# Altium footprint library PHOENIX THD.PcbLib: 109 footprints (part 2 of 8) (continued)
## PHOENIX_1725724 [mm] "Micro PCB Terminal Block, Pitch 2.54mm, 9 Positions, Screw Connection" (continued)
3D body "PHOENIX_1725724.stp": height 8.5, standoff -3.5, extent -11.66,-3.1 11.66,3.1

## PHOENIX_1725737 [mm] "Micro PCB Terminal Block, Pitch 2.54mm, 10 Positions, Screw Connection"
height 8.5
pads (10):
  round 1.8 hole 1.1: 1(-11.43,0) 2(-8.89,0) 3(-6.35,0) 4(-3.81,0) 5(-1.27,0) 6(1.27,0) 7(3.81,0) 8(6.35,0) 9(8.89,0) 10(11.43,0)
Top Overlay:
  circle w0.2: c-11.43,-0.05 r1.18
  circle w0.2: c-8.89,-0.05 r1.18
  circle w0.2: c-6.35,-0.05 r1.18
  circle w0.2: c-3.81,-0.05 r1.18
  circle w0.2: c-1.27,-0.05 r1.18
  circle w0.2: c1.27,-0.05 r1.18
  circle w0.2: c3.81,-0.05 r1.18
  circle w0.2: c6.35,-0.05 r1.18
  circle w0.2: c8.89,-0.05 r1.18
  circle w0.2: c11.43,-0.05 r1.18
  lines w0.2: -12.93,-2.8 12.93,-2.8 ; -12.93,-2.361 12.93,-2.361 ; -12.93,-1.51 12.93,-1.51 ; -12.93,-1.22 12.93,-1.22 ; -12.93,1.132 12.93,1.132 ; -12.93,1.417 12.93,1.417 ; -11.43,-3.81 -11.43,-3.429 ; -8.89,-3.81 -8.89,-3.429 ; -6.35,-3.81 -6.35,-3.429 ; -3.81,-3.81 -3.81,-3.429 ; -1.27,-3.81 -1.27,-3.429 ; 1.27,-3.81 1.27,-3.429 ; 3.81,-3.81 3.81,-3.429 ; 6.35,-3.81 6.35,-3.429 ; 8.89,-3.81 8.89,-3.429 ; 11.43,-3.81 11.43,-3.429 ; -12.93,-3.1 12.93,-3.1 12.93,3.1 -12.93,3.1 -12.93,-3.1
  text "9" at 8.509,1.778 h1
  text "8" at 5.969,1.778 h1
  text "6" at 0.889,1.778 h1
  text "4" at -4.191,1.778 h1
  text "1" at -11.557,1.778 h1
  text "2" at -9.271,1.778 h1
  text "3" at -6.731,1.778 h1
  text "5" at -1.651,1.778 h1
  text "7" at 3.429,1.778 h1
  text "10" at 11.049,1.778 h1
Mechanical 8:
  lines w0.1: -0.55,0 0,0 0,-0.55 ; -11.98,0 -11.43,0 ; -11.98,0 -11.43,0 ; -11.98,0 -11.43,0 ; -11.98,0 -11.43,0 ; -11.43,-0.55 -11.43,0 ; -11.43,-0.55 -11.43,0 ; -11.43,-0.55 -11.43,0 ; -11.43,-0.55 -11.43,0 ; -9.44,0 -8.89,0 ; -9.44,0 -8.89,0 ; -9.44,0 -8.89,0 ; -9.44,0 -8.89,0 ; -8.89,-0.55 -8.89,0 ; -8.89,-0.55 -8.89,0 ; -8.89,-0.55 -8.89,0 ; -8.89,-0.55 -8.89,0 ; -6.9,0 -6.35,0 ; -6.9,0 -6.35,0 ; -6.9,0 -6.35,0 ; -6.9,0 -6.35,0 ; -6.35,-0.55 -6.35,0 ; -6.35,-0.55 -6.35,0 ; -6.35,-0.55 -6.35,0 ; -6.35,-0.55 -6.35,0 ; -4.36,0 -3.81,0 ; -4.36,0 -3.81,0 ; -4.36,0 -3.81,0 ; -4.36,0 -3.81,0 ; -3.81,-0.55 -3.81,0 ; -3.81,-0.55 -3.81,0 ; -3.81,-0.55 -3.81,0 ; -3.81,-0.55 -3.81,0 ; -1.82,0 -1.27,0 ; -1.82,0 -1.27,0 ; -1.82,0 -1.27,0 ; -1.82,0 -1.27,0 ; -1.27,-0.55 -1.27,0 ; -1.27,-0.55 -1.27,0 ; -1.27,-0.55 -1.27,0 ; -1.27,-0.55 -1.27,0 ; 0.72,0 1.27,0 ; 0.72,0 1.27,0 ; 0.72,0 1.27,0 ; 0.72,0 1.27,0 ; 1.27,-0.55 1.27,0 ; 1.27,-0.55 1.27,0 ; 1.27,-0.55 1.27,0 ; 1.27,-0.55 1.27,0 ; 3.26,0 3.81,0 ; 3.26,0 3.81,0 ; 3.26,0 3.81,0 ; 3.26,0 3.81,0 ; 3.81,-0.55 3.81,0 ; 3.81,-0.55 3.81,0 ; 3.81,-0.55 3.81,0 ; 3.81,-0.55 3.81,0 ; 5.8,0 6.35,0 ; 5.8,0 6.35,0 ; 5.8,0 6.35,0 ; 5.8,0 6.35,0 ; 6.35,-0.55 6.35,0 ; 6.35,-0.55 6.35,0 ; 6.35,-0.55 6.35,0 ; 6.35,-0.55 6.35,0 ; 8.34,0 8.89,0 ; 8.34,0 8.89,0 ; 8.34,0 8.89,0 ; 8.34,0 8.89,0 ; 8.89,-0.55 8.89,0 ; 8.89,-0.55 8.89,0 ; 8.89,-0.55 8.89,0 ; 8.89,-0.55 8.89,0 ; 10.88,0 11.43,0 ; 10.88,0 11.43,0 ; 10.88,0 11.43,0 ; 10.88,0 11.43,0 ; 11.43,-0.55 11.43,0 ; 11.43,-0.55 11.43,0 ; 11.43,-0.55 11.43,0 ; 11.43,-0.55 11.43,0
Mechanical 14:
  circle w0.1: c8.89,-0.05 r1.1
  circle w0.1: c1.27,-0.05 r1.1
  circle w0.1: c-3.81,-0.05 r1.1
  circle w0.1: c-6.35,-0.05 r1.1
  circle w0.1: c-8.89,-0.05 r1.1
  circle w0.1: c-11.43,-0.05 r1.1
  circle w0.1: c-1.27,-0.05 r1.1
  circle w0.1: c3.81,-0.05 r1.1
  circle w0.1: c6.35,-0.05 r1.1
  circle w0.1: c11.43,-0.05 r1.1
  lines w0.1: -12.93,-2.8 12.93,-2.8 ; -12.93,-2.361 12.93,-2.361 ; -12.93,-1.51 12.93,-1.51 ; -12.93,-1.22 12.93,-1.22 ; -12.93,1.132 12.93,1.132 ; -12.93,1.417 12.93,1.417 ; -12.364,-0.631 -10.849,0.884 ; -12.011,-0.984 -10.496,0.531 ; -9.824,-0.631 -8.309,0.884 ; -9.471,-0.984 -7.956,0.531 ; -7.284,-0.631 -5.769,0.884 ; -6.931,-0.984 -5.416,0.531 ; -4.744,-0.631 -3.229,0.884 ; -4.391,-0.984 -2.876,0.531 ; -2.204,-0.631 -0.689,0.884 ; -1.851,-0.984 -0.336,0.531 ; 0.336,-0.631 1.851,0.884 ; 0.689,-0.984 2.204,0.531 ; 2.876,-0.631 4.391,0.884 ; 3.229,-0.984 4.744,0.531 ; 5.416,-0.631 6.931,0.884 ; 5.769,-0.984 7.284,0.531 ; 7.956,-0.631 9.471,0.884 ; 8.309,-0.984 9.824,0.531 ; 10.496,-0.631 12.011,0.884 ; 10.849,-0.984 12.364,0.531 ; -12.93,-3.1 12.93,-3.1 12.93,3.1 -12.93,3.1 -12.93,-3.1 ; -11.905,1.757 cw(c-11.43,1.6) -10.955,1.757 cw(c-11.003,1.741) -10.982,1.696 cw(c-11.43,2.696) -11.878,1.696 cw(c-11.857,1.741) -11.905,1.757 ; -9.365,1.757 cw(c-8.89,1.6) -8.415,1.757 cw(c-8.463,1.741) -8.442,1.696 cw(c-8.89,2.696) -9.338,1.696 cw(c-9.317,1.741) -9.365,1.757 ; -6.825,1.757 cw(c-6.35,1.6) -5.875,1.757 cw(c-5.923,1.741) -5.902,1.696 cw(c-6.35,2.696) -6.798,1.696 cw(c-6.777,1.741) -6.825,1.757 ; -4.285,1.757 cw(c-3.81,1.6) -3.335,1.757 cw(c-3.383,1.741) -3.362,1.696 cw(c-3.81,2.696) -4.258,1.696 cw(c-4.237,1.741) -4.285,1.757 ; -1.745,1.757 cw(c-1.27,1.6) -0.795,1.757 cw(c-0.843,1.741) -0.822,1.696 cw(c-1.27,2.696) -1.718,1.696 cw(c-1.697,1.741) -1.745,1.757 ; 0.795,1.757 cw(c1.27,1.6) 1.745,1.757 cw(c1.697,1.741) 1.718,1.696 cw(c1.27,2.696) 0.822,1.696 cw(c0.843,1.741) 0.795,1.757 ; 3.335,1.757 cw(c3.81,1.6) 4.285,1.757 cw(c4.237,1.741) 4.258,1.696 cw(c3.81,2.696) 3.362,1.696 cw(c3.383,1.741) 3.335,1.757 ; 5.875,1.757 cw(c6.35,1.6) 6.825,1.757 cw(c6.777,1.741) 6.798,1.696 cw(c6.35,2.696) 5.902,1.696 cw(c5.923,1.741) 5.875,1.757 ; 8.415,1.757 cw(c8.89,1.6) 9.365,1.757 cw(c9.317,1.741) 9.338,1.696 cw(c8.89,2.696) 8.442,1.696 cw(c8.463,1.741) 8.415,1.757 ; 10.955,1.757 ccw(c11.003,1.741) 10.982,1.696 ccw(c11.43,2.696) 11.878,1.696 ccw(c11.857,1.741) 11.905,1.757 ccw(c11.43,1.6) 10.955,1.757
3D body "PHOENIX_1725737.stp": height 8.5, standoff -3.5, extent -12.93,-3.1 12.93,3.1

## PHOENIX_1727036 [mm] "PCB Terminal Block, Pitch 3.81mm, 4 Positions, Screw Connection"
height 8.5
pads (4):
  round 1.8 hole 1.1: 1(-5.715,0) 2(-1.905,0) 3(1.905,0) 4(5.715,0)
Top Overlay:
  circle w0.2: c-5.715,-0.05 r1.4
  circle w0.2: c-1.905,-0.05 r1.4
  circle w0.2: c1.905,-0.05 r1.4
  circle w0.2: c5.715,-0.05 r1.4
  circle w0.2: c-5.715,-0.05 r1.45
  circle w0.2: c-1.905,-0.05 r1.45
  circle w0.2: c5.715,-0.05 r1.45
  circle w0.2: c1.905,-0.05 r1.45
  lines w0.2: -7.62,-3.3 7.62,-3.3 ; -7.62,-2.861 7.62,-2.861 ; -7.62,-2.049 7.62,-2.049 ; -7.62,-1.566 7.62,-1.566 ; -7.62,1.487 7.62,1.487 ; -7.62,1.962 -6.017,1.962 ; -6.921,-0.761 -6.848,-0.688 ; -6.426,-1.256 -6.353,-1.183 ; -5.413,1.962 -2.207,1.962 ; -5.077,1.083 -5.004,1.156 ; -4.582,0.588 -4.509,0.661 ; -3.111,-0.761 -3.038,-0.688 ; -2.616,-1.256 -2.543,-1.183 ; -1.603,1.962 1.603,1.962 ; -1.267,1.083 -1.194,1.156 ; -0.772,0.588 -0.699,0.661 ; 0.699,-0.761 0.772,-0.688 ; 1.194,-1.256 1.267,-1.183 ; 2.207,1.962 5.413,1.962 ; 2.543,1.083 2.616,1.156 ; 3.038,0.588 3.111,0.661 ; 4.509,-0.761 4.582,-0.688 ; 5.004,-1.256 5.077,-1.183 ; 6.017,1.962 7.62,1.962 ; 6.353,1.083 6.426,1.156 ; 6.848,0.588 6.921,0.661 ; -7.62,-3.6 -7.62,3.7 7.62,3.7 7.62,-3.6 -7.62,-3.6 ; -6.016,1.923 ccw(c-5.715,2.098) -5.414,1.923 ccw(c-5.715,1.948) -6.016,1.923 ; -2.206,1.923 ccw(c-1.905,2.098) -1.604,1.923 ccw(c-1.905,1.948) -2.206,1.923 ; 1.604,1.923 ccw(c1.905,2.098) 2.206,1.923 ccw(c1.905,1.948) 1.604,1.923 ; 5.414,1.923 ccw(c5.715,2.098) 6.016,1.923 ccw(c5.715,1.948) 5.414,1.923
  text "4" at 4.38,2.45 h0.8
  text "1" at -4.975,2.425 h0.8
Mechanical 8:
  lines w0.1: -6.215,0 -5.715,0 ; -5.715,-0.5 -5.715,0 ; -5.715,0.5 -5.715,0 ; -5.215,0 -5.715,0 ; -2.405,0 -1.905,0 ; -1.905,-0.5 -1.905,0 ; -1.905,0.5 -1.905,0 ; -1.405,0 -1.905,0 ; -0.5,0 0,0 ; 0,-0.5 0,0 ; 0,0.5 0,0 ; 0.5,0 0,0 ; 1.405,0 1.905,0 ; 1.905,-0.5 1.905,0 ; 1.905,0.5 1.905,0 ; 2.405,0 1.905,0 ; 5.215,0 5.715,0 ; 5.715,-0.5 5.715,0 ; 5.715,0.5 5.715,0 ; 6.215,0 5.715,0
Mechanical 14:
  circle w0.1: c-5.715,-0.05 r1.4
  circle w0.1: c-1.905,-0.05 r1.4
  circle w0.1: c1.905,-0.05 r1.4
  circle w0.1: c5.715,-0.05 r1.4
  circle w0.1: c-5.715,-0.05 r1.45
  circle w0.1: c-1.905,-0.05 r1.45
  circle w0.1: c5.715,-0.05 r1.45
  circle w0.1: c1.905,-0.05 r1.45
  lines w0.1: -7.62,-3.3 7.62,-3.3 ; -7.62,-2.861 7.62,-2.861 ; -7.62,-2.049 7.62,-2.049 ; -7.62,-1.566 7.62,-1.566 ; -7.62,1.487 7.62,1.487 ; -7.62,1.962 -6.017,1.962 ; -6.921,-0.761 -5.004,1.156 ; -6.426,-1.256 -4.509,0.661 ; -5.413,1.962 -2.207,1.962 ; -3.111,-0.761 -1.194,1.156 ; -2.616,-1.256 -0.699,0.661 ; -1.603,1.962 1.603,1.962 ; 0.699,-0.761 2.616,1.156 ; 1.194,-1.256 3.111,0.661 ; 2.207,1.962 5.413,1.962 ; 4.509,-0.761 6.426,1.156 ; 5.004,-1.256 6.921,0.661 ; 6.017,1.962 7.62,1.962 ; -7.62,-3.6 -7.62,3.7 7.62,3.7 7.62,-3.6 -7.62,-3.6 ; -6.016,1.923 ccw(c-5.715,2.098) -5.414,1.923 ccw(c-5.715,1.948) -6.016,1.923 ; -2.206,1.923 ccw(c-1.905,2.098) -1.604,1.923 ccw(c-1.905,1.948) -2.206,1.923 ; 1.604,1.923 ccw(c1.905,2.098) 2.206,1.923 ccw(c1.905,1.948) 1.604,1.923 ; 5.414,1.923 ccw(c5.715,2.098) 6.016,1.923 ccw(c5.715,1.948) 5.414,1.923
  text "4" at 4.38,2.45 h0.8
  text "1" at -4.975,2.425 h0.8
3D body "PHOENIX_1727036.stp": height 8.5, standoff -3.5, extent -7.62,-3.6 7.62,3.7

## PHOENIX_1727065 [mm] "PCB Terminal Block, Pitch 3.81mm, 7 Positions, Screw Connection"
height 8.5
pads (7):
  round 1.8 hole 1.1: 1(-11.43,0) 2(-7.62,0) 3(-3.81,0) 4(0,0) 5(3.81,0) 6(7.62,0) 7(11.43,0)
Top Overlay:
  circle w0.2: c11.43,-0.05 r1.4
  circle w0.2: c11.43,-0.05 r1.45
  circle w0.2: c7.62,-0.05 r1.4
  circle w0.2: c7.62,-0.05 r1.45
  circle w0.2: c3.81,-0.05 r1.4
  circle w0.2: c3.81,-0.05 r1.45
  circle w0.2: c0,-0.05 r1.4
  circle w0.2: c0,-0.05 r1.45
  circle w0.2: c-3.81,-0.05 r1.4
  circle w0.2: c-3.81,-0.05 r1.45
  circle w0.2: c-7.62,-0.05 r1.4
  circle w0.2: c-7.62,-0.05 r1.45
  circle w0.2: c-11.43,-0.05 r1.4
  circle w0.2: c-11.43,-0.05 r1.45
  lines w0.2: -13.335,-3.3 13.335,-3.3 ; -13.335,-2.861 13.335,-2.861 ; -13.335,-2.049 13.335,-2.049 ; -13.335,-1.566 13.335,-1.566 ; -13.335,1.487 13.335,1.487 ; -13.335,1.962 -11.732,1.962 ; -12.636,-0.761 -12.563,-0.688 ; -12.141,-1.256 -12.068,-1.183 ; -11.128,1.962 -7.922,1.962 ; -10.792,1.083 -10.719,1.156 ; -10.297,0.588 -10.224,0.661 ; -8.826,-0.761 -8.753,-0.688 ; -8.331,-1.256 -8.258,-1.183 ; -7.318,1.962 -4.112,1.962 ; -6.982,1.083 -6.909,1.156 ; -6.487,0.588 -6.414,0.661 ; -5.016,-0.761 -4.943,-0.688 ; -4.521,-1.256 -4.448,-1.183 ; -3.508,1.962 -0.302,1.962 ; -3.172,1.083 -3.099,1.156 ; -2.677,0.588 -2.604,0.661 ; -1.206,-0.761 -1.133,-0.688 ; -0.711,-1.256 -0.638,-1.183 ; 0.302,1.962 3.508,1.962 ; 0.638,1.083 0.711,1.156 ; 1.133,0.588 1.206,0.661 ; 2.604,-0.761 2.677,-0.688 ; 3.099,-1.256 3.172,-1.183 ; 4.112,1.962 7.318,1.962 ; 4.448,1.083 4.521,1.156 ; 4.943,0.588 5.016,0.661 ; 6.414,-0.761 6.487,-0.688 ; 6.909,-1.256 6.982,-1.183 ; 7.922,1.962 11.128,1.962 ; 8.258,1.083 8.331,1.156 ; 8.753,0.588 8.826,0.661 ; 10.224,-0.761 10.297,-0.688 ; 10.719,-1.256 10.792,-1.183 ; 11.732,1.962 13.335,1.962 ; 12.068,1.083 12.141,1.156 ; 12.563,0.588 12.636,0.661 ; -13.335,-3.6 -13.335,3.7 13.335,3.7 13.335,-3.6 -13.335,-3.6 ; -11.731,1.923 ccw(c-11.43,2.098) -11.129,1.923 ccw(c-11.43,1.948) -11.731,1.923 ; -7.921,1.923 ccw(c-7.62,2.098) -7.319,1.923 ccw(c-7.62,1.948) -7.921,1.923 ; -4.111,1.923 ccw(c-3.81,2.098) -3.509,1.923 ccw(c-3.81,1.948) -4.111,1.923 ; -0.301,1.923 ccw(c0,2.098) 0.301,1.923 ccw(c0,1.948) -0.301,1.923 ; 3.509,1.923 ccw(c3.81,2.098) 4.111,1.923 ccw(c3.81,1.948) 3.509,1.923 ; 7.319,1.923 ccw(c7.62,2.098) 7.921,1.923 ccw(c7.62,1.948) 7.319,1.923 ; 11.129,1.923 ccw(c11.43,2.098) 11.731,1.923 ccw(c11.43,1.948) 11.129,1.923
  text "7" at 10.158,2.425 h0.8
  text "1" at -10.69,2.425 h0.8
Mechanical 8:
  lines w0.1: -11.93,0 -11.43,0 ; -11.43,-0.5 -11.43,0 ; -11.43,0.5 -11.43,0 ; -10.93,0 -11.43,0 ; -8.12,0 -7.62,0 ; -7.62,-0.5 -7.62,0 ; -7.62,0.5 -7.62,0 ; -7.12,0 -7.62,0 ; -4.31,0 -3.81,0 ; -3.81,-0.5 -3.81,0 ; -3.81,0.5 -3.81,0 ; -3.31,0 -3.81,0 ; -0.5,0 0,0 ; 0,-0.5 0,0 ; 0,0.5 0,0 ; 0.5,0 0,0 ; 3.31,0 3.81,0 ; 3.81,-0.5 3.81,0 ; 3.81,0.5 3.81,0 ; 4.31,0 3.81,0 ; 7.12,0 7.62,0 ; 7.62,-0.5 7.62,0 ; 7.62,0.5 7.62,0 ; 8.12,0 7.62,0 ; 10.93,0 11.43,0 ; 11.43,-0.5 11.43,0 ; 11.43,0.5 11.43,0 ; 11.93,0 11.43,0
Mechanical 14:
  circle w0.1: c11.43,-0.05 r1.4
  circle w0.1: c11.43,-0.05 r1.45
  circle w0.1: c7.62,-0.05 r1.4
  circle w0.1: c7.62,-0.05 r1.45
  circle w0.1: c3.81,-0.05 r1.4
  circle w0.1: c3.81,-0.05 r1.45
  circle w0.1: c0,-0.05 r1.4
  circle w0.1: c0,-0.05 r1.45
  circle w0.1: c-3.81,-0.05 r1.4
  circle w0.1: c-3.81,-0.05 r1.45
  circle w0.1: c-7.62,-0.05 r1.4
  circle w0.1: c-7.62,-0.05 r1.45
  circle w0.1: c-11.43,-0.05 r1.4
  circle w0.1: c-11.43,-0.05 r1.45
  lines w0.1: -13.335,-3.3 13.335,-3.3 ; -13.335,-2.861 13.335,-2.861 ; -13.335,-2.049 13.335,-2.049 ; -13.335,-1.566 13.335,-1.566 ; -13.335,1.487 13.335,1.487 ; -13.335,1.962 -11.732,1.962 ; -12.636,-0.761 -10.719,1.156 ; -12.141,-1.256 -10.224,0.661 ; -11.128,1.962 -7.922,1.962 ; -8.826,-0.761 -6.909,1.156 ; -8.331,-1.256 -6.414,0.661 ; -7.318,1.962 -4.112,1.962 ; -5.016,-0.761 -3.099,1.156 ; -4.521,-1.256 -2.604,0.661 ; -3.508,1.962 -0.302,1.962 ; -1.206,-0.761 0.711,1.156 ; -0.711,-1.256 1.206,0.661 ; 0.302,1.962 3.508,1.962 ; 2.604,-0.761 4.521,1.156 ; 3.099,-1.256 5.016,0.661 ; 4.112,1.962 7.318,1.962 ; 6.414,-0.761 8.331,1.156 ; 6.909,-1.256 8.826,0.661 ; 7.922,1.962 11.128,1.962 ; 10.224,-0.761 12.141,1.156 ; 10.719,-1.256 12.636,0.661 ; 11.732,1.962 13.335,1.962 ; -13.335,-3.6 -13.335,3.7 13.335,3.7 13.335,-3.6 -13.335,-3.6 ; -11.731,1.923 ccw(c-11.43,2.098) -11.129,1.923 ccw(c-11.43,1.948) -11.731,1.923 ; -7.921,1.923 ccw(c-7.62,2.098) -7.319,1.923 ccw(c-7.62,1.948) -7.921,1.923 ; -4.111,1.923 ccw(c-3.81,2.098) -3.509,1.923 ccw(c-3.81,1.948) -4.111,1.923 ; -0.301,1.923 ccw(c0,2.098) 0.301,1.923 ccw(c0,1.948) -0.301,1.923 ; 3.509,1.923 ccw(c3.81,2.098) 4.111,1.923 ccw(c3.81,1.948) 3.509,1.923 ; 7.319,1.923 ccw(c7.62,2.098) 7.921,1.923 ccw(c7.62,1.948) 7.319,1.923 ; 11.129,1.923 ccw(c11.43,2.098) 11.731,1.923 ccw(c11.43,1.948) 11.129,1.923
  text "7" at 10.158,2.425 h0.8
  text "1" at -10.69,2.425 h0.8
3D body "PHOENIX_1727065.stp": height 8.5, standoff -3.5, extent -13.335,-3.6 13.335,3.7

## PHOENIX_1727081 [mm] "PCB Terminal Block, Pitch 3.81mm, 9 Positions, Screw Connection"
height 8.5
pads (9):
  round 1.8 hole 1.1: 1(-15.24,0) 2(-11.43,0) 3(-7.62,0) 4(-3.81,0) 5(0,0) 6(3.81,0) 7(7.62,0) 8(11.43,0) 9(15.24,0)
Top Overlay:
  circle w0.2: c-15.24,0 r1.45
  circle w0.2: c-15.24,0 r1.4
  circle w0.2: c-11.43,0 r1.45
  circle w0.2: c-11.43,0 r1.4
  circle w0.2: c-7.62,-0.05 r1.45
  circle w0.2: c-7.62,-0.05 r1.4
  circle w0.2: c-3.81,-0.05 r1.45
  circle w0.2: c-3.81,-0.05 r1.4
  circle w0.2: c0,-0.05 r1.45
  circle w0.2: c0,-0.05 r1.4
  circle w0.2: c3.81,-0.05 r1.45
  circle w0.2: c3.81,-0.05 r1.4
  circle w0.2: c7.62,-0.05 r1.45
  circle w0.2: c7.62,-0.05 r1.4
  circle w0.2: c11.43,-0.05 r1.45
  circle w0.2: c11.43,-0.05 r1.4
  circle w0.2: c15.24,-0.05 r1.45
  circle w0.2: c15.24,-0.05 r1.4
  lines w0.2: -17.145,-3.6 17.145,-3.6 17.145,3.7 -17.145,3.7 -17.145,-3.55 ; -17.145,-3.3 17.145,-3.3 ; -17.145,-2.861 17.145,-2.861 ; -17.145,-2.049 17.145,-2.049 ; -17.145,-1.566 17.145,-1.566 ; -17.145,1.487 17.145,1.487 ; -17.145,2.012 -15.539,2.012 ; -16.446,-0.711 -16.373,-0.638 ; -15.951,-1.206 -15.878,-1.133 ; -14.602,1.133 -14.529,1.206 ; -14.107,0.638 -14.034,0.711 ; -12.636,-0.711 -12.563,-0.638 ; -12.141,-1.206 -12.068,-1.133 ; -10.792,1.133 -10.719,1.206 ; -10.297,0.638 -10.224,0.711 ; -8.826,-0.711 -8.753,-0.638 ; -8.331,-1.206 -8.258,-1.133 ; -7.919,2.012 -11.131,2.012 ; -6.982,1.083 -6.909,1.156 ; -6.487,0.588 -6.414,0.661 ; -5.016,-0.761 -4.943,-0.688 ; -4.521,-1.256 -4.448,-1.183 ; -3.172,1.083 -3.099,1.156 ; -2.677,0.588 -2.604,0.661 ; -1.206,-0.761 -1.133,-0.688 ; -0.711,-1.256 -0.638,-1.183 ; 0.638,1.083 0.711,1.156 ; 1.133,0.588 1.206,0.661 ; 2.604,-0.761 2.677,-0.688 ; 3.099,-1.256 3.172,-1.183 ; 4.448,1.083 4.521,1.156 ; 4.943,0.588 5.016,0.661 ; 6.414,-0.761 6.487,-0.688 ; 6.909,-1.256 6.982,-1.183 ; 8.258,1.083 8.331,1.156 ; 8.753,0.588 8.826,0.661 ; 10.224,-0.761 10.297,-0.688 ; 10.719,-1.256 10.792,-1.183 ; 12.068,1.083 12.141,1.156 ; 12.563,0.588 12.636,0.661 ; 14.034,-0.761 14.107,-0.688 ; 14.529,-1.256 14.602,-1.183 ; 15.878,1.083 15.951,1.156 ; 16.373,0.588 16.446,0.661 ; 17.145,1.962 15.539,1.962 ; -15.539,2.012 ccw(c-15.24,2.115) -14.941,2.012 ; -15.539,2.012 cw(c-15.24,2.001) -14.941,2.012 ; -14.941,2.012 -11.729,2.012 ; -11.729,2.012 ccw(c-11.43,2.115) -11.131,2.012 ; -11.729,2.012 cw(c-11.43,2.001) -11.131,2.012 ; -7.321,1.962 cw(c-7.62,2.065) -7.919,1.962 cw(c-7.62,1.951) -7.321,1.962 ; -7.321,1.962 -4.109,1.962 ; -4.109,1.962 ccw(c-3.81,2.065) -3.511,1.962 ; -4.109,1.962 cw(c-3.81,1.951) -3.511,1.962 ; -3.511,1.962 -0.299,1.962 ; -0.299,1.962 ccw(c0,2.065) 0.299,1.962 ; -0.299,1.962 cw(c0,1.951) 0.299,1.962 ; 0.299,1.962 3.511,1.962 ; 3.511,1.962 ccw(c3.81,2.065) 4.109,1.962 ; 3.511,1.962 cw(c3.81,1.951) 4.109,1.962 ; 4.109,1.962 7.321,1.962 ; 7.321,1.962 ccw(c7.62,2.065) 7.919,1.962 ; 7.321,1.962 cw(c7.62,1.951) 7.919,1.962 ; 7.919,1.962 11.131,1.962 ; 11.131,1.962 ccw(c11.43,2.065) 11.729,1.962 ; 11.131,1.962 cw(c11.43,1.951) 11.729,1.962 ; 11.729,1.962 14.941,1.962 ; 14.941,1.962 ccw(c15.24,2.065) 15.539,1.962 ; 14.941,1.962 cw(c15.24,1.951) 15.539,1.962
  text "1" at -14.5,2.425 h0.8
  text "9" at 13.93,2.425 h0.8
Mechanical 8:
  lines w0.1: -15.74,0 -15.24,0 ; -15.24,-0.5 -15.24,0 ; -15.24,0.5 -15.24,0 ; -14.74,0 -15.24,0 ; -11.93,0 -11.43,0 ; -11.43,-0.5 -11.43,0 ; -11.43,0.5 -11.43,0 ; -10.93,0 -11.43,0 ; -8.12,0 -7.62,0 ; -7.62,-0.5 -7.62,0 ; -7.62,0.5 -7.62,0 ; -7.12,0 -7.62,0 ; -4.31,0 -3.81,0 ; -3.81,-0.5 -3.81,0 ; -3.81,0.5 -3.81,0 ; -3.31,0 -3.81,0 ; -0.5,0 0,0 ; 0,-0.5 0,0 ; 0,0.5 0,0 ; 0.5,0 0,0 ; 3.31,0 3.81,0 ; 3.81,-0.5 3.81,0 ; 3.81,0.5 3.81,0 ; 4.31,0 3.81,0 ; 7.12,0 7.62,0 ; 7.62,-0.5 7.62,0 ; 7.62,0.5 7.62,0 ; 8.12,0 7.62,0 ; 10.93,0 11.43,0 ; 11.43,-0.5 11.43,0 ; 11.43,0.5 11.43,0 ; 11.93,0 11.43,0 ; 14.74,0 15.24,0 ; 15.24,-0.5 15.24,0 ; 15.24,0.5 15.24,0 ; 15.74,0 15.24,0
Mechanical 14:
  circle w0.1: c-15.24,0 r1.45
  circle w0.1: c-15.24,0 r1.4
  circle w0.1: c-11.43,0 r1.45
  circle w0.1: c-11.43,0 r1.4
  circle w0.1: c-7.62,-0.05 r1.45
  circle w0.1: c-7.62,-0.05 r1.4
  circle w0.1: c-3.81,-0.05 r1.45
  circle w0.1: c-3.81,-0.05 r1.4
  circle w0.1: c0,-0.05 r1.45
  circle w0.1: c0,-0.05 r1.4
  circle w0.1: c3.81,-0.05 r1.45
  circle w0.1: c3.81,-0.05 r1.4
  circle w0.1: c7.62,-0.05 r1.45
  circle w0.1: c7.62,-0.05 r1.4
  circle w0.1: c11.43,-0.05 r1.45
  circle w0.1: c11.43,-0.05 r1.4
  circle w0.1: c15.24,-0.05 r1.45
  circle w0.1: c15.24,-0.05 r1.4
  lines w0.1: -17.145,-3.6 17.145,-3.6 17.145,3.7 -17.145,3.7 -17.145,-3.55 ; -17.145,-3.3 17.145,-3.3 ; -17.145,-2.861 17.145,-2.861 ; -17.145,-2.049 17.145,-2.049 ; -17.145,-1.566 17.145,-1.566 ; -17.145,1.487 17.145,1.487 ; -17.145,2.012 -15.539,2.012 ; -16.446,-0.711 -14.529,1.206 ; -15.951,-1.206 -14.034,0.711 ; -12.636,-0.711 -10.719,1.206 ; -12.141,-1.206 -10.224,0.711 ; -8.826,-0.761 -6.909,1.156 ; -8.331,-1.256 -6.414,0.661 ; -7.919,2.012 -11.131,2.012 ; -5.016,-0.761 -3.099,1.156 ; -4.521,-1.256 -2.604,0.661 ; -1.206,-0.761 0.711,1.156 ; -0.711,-1.256 1.206,0.661 ; 2.604,-0.761 4.521,1.156 ; 3.099,-1.256 5.016,0.661 ; 6.414,-0.761 8.331,1.156 ; 6.909,-1.256 8.826,0.661 ; 10.224,-0.761 12.141,1.156 ; 10.719,-1.256 12.636,0.661 ; 14.034,-0.761 15.951,1.156 ; 14.529,-1.256 16.446,0.661 ; 17.145,1.962 15.539,1.962 ; -15.539,2.012 ccw(c-15.24,2.115) -14.941,2.012 ; -15.539,2.012 cw(c-15.24,2.001) -14.941,2.012 ; -14.941,2.012 -11.729,2.012 ; -11.729,2.012 ccw(c-11.43,2.115) -11.131,2.012 ; -11.729,2.012 cw(c-11.43,2.001) -11.131,2.012 ; -7.321,1.962 cw(c-7.62,2.065) -7.919,1.962 cw(c-7.62,1.951) -7.321,1.962 ; -7.321,1.962 -4.109,1.962 ; -4.109,1.962 ccw(c-3.81,2.065) -3.511,1.962 ; -4.109,1.962 cw(c-3.81,1.951) -3.511,1.962 ; -3.511,1.962 -0.299,1.962 ; -0.299,1.962 ccw(c0,2.065) 0.299,1.962 ; -0.299,1.962 cw(c0,1.951) 0.299,1.962 ; 0.299,1.962 3.511,1.962 ; 3.511,1.962 ccw(c3.81,2.065) 4.109,1.962 ; 3.511,1.962 cw(c3.81,1.951) 4.109,1.962 ; 4.109,1.962 7.321,1.962 ; 7.321,1.962 ccw(c7.62,2.065) 7.919,1.962 ; 7.321,1.962 cw(c7.62,1.951) 7.919,1.962 ; 7.919,1.962 11.131,1.962 ; 11.131,1.962 ccw(c11.43,2.065) 11.729,1.962 ; 11.131,1.962 cw(c11.43,1.951) 11.729,1.962 ; 11.729,1.962 14.941,1.962 ; 14.941,1.962 ccw(c15.24,2.065) 15.539,1.962 ; 14.941,1.962 cw(c15.24,1.951) 15.539,1.962
  text "1" at -14.5,2.425 h0.8
  text "9" at 13.93,2.425 h0.8
3D body "PHOENIX_1727081.stp": height 8.5, standoff -3.5, extent -17.145,-3.6 17.145,3.7